# Altium integrated library Samtec 2,54 mm Pitch Socket Strips.IntLib: 489 symbols (part 2 of 4)
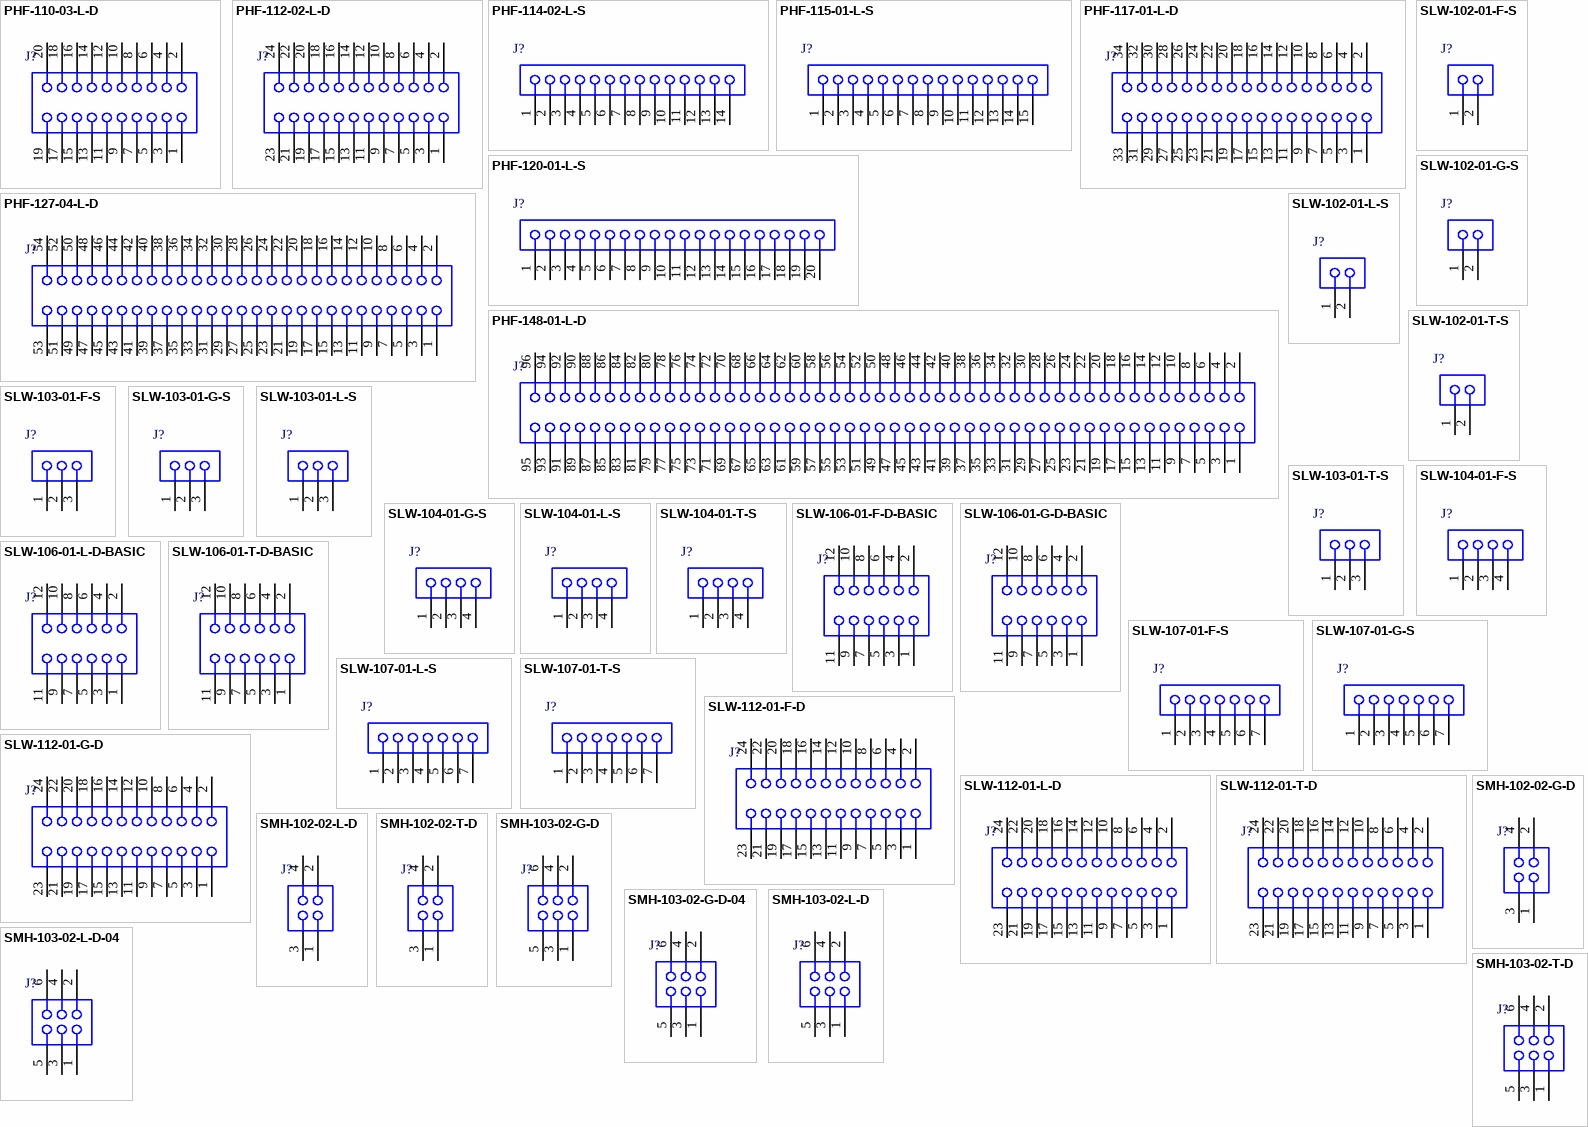
[diagram p14: symbols PHF-110-03-L-D to SMH-103-02-T-D]

## SLW-103-01-F-S
designator J?
Low Profile Socket Strips, Through-hole, Vertical, -55 to 125 degC, 2.54 mm Pitch, 3-Pin, Female, RoHS; Manufacturer: Samtec; PartNumber: SLW-103-01-F-S; Pitch: 2.54 mm; DatasheetVersion: F-214; PackageVersion: X, 9/1987; PackageReference: SLW-103-01-X-S; PackageDescription: Low Profile Socket Strip; Orientation: Vertical; RoHS: True; Temperature Range: -55 to 125 degC; Mounting Technology: Through-hole; ComponentLink1Description: Manufacturer URL; ComponentLink1URL: http://www.samtec.com; ComponentLink2Description: Datasheet; ComponentLink2URL: http://www.samtec.com/documents/webfiles/pdf/SLW.PDF; ComponentLink3Description: Package Specification; ComponentLink3URL: http://www.samtec.com/documents/webfiles/cpdf/SLW-1XX-01-X-X-MKT.pdf
footprint SMTC-SLW-103-01-X-S (Low Profile Socket Strip, 1x3 Pins, Vertical, 2.54mm Pitch, Female)
pins: 1, 2, 3

## SLW-103-01-G-S
designator J?
Low Profile Socket Strips, Through-hole, Vertical, -55 to 125 degC, 2.54 mm Pitch, 3-Pin, Female, RoHS; Manufacturer: Samtec; PartNumber: SLW-103-01-G-S; Pitch: 2.54 mm; DatasheetVersion: F-214; PackageVersion: X, 9/1987; PackageReference: SLW-103-01-X-S; PackageDescription: Low Profile Socket Strip; Supplier 1: Digi-Key; Supplier Part Number 1: SAM1089-03-ND; Supplier 2: Newark; Supplier Part Number 2: 11P6851; Orientation: Vertical; RoHS: True; Temperature Range: -55 to 125 degC; Mounting Technology: Through-hole; ComponentLink1Description: Manufacturer URL; ComponentLink1URL: http://www.samtec.com; ComponentLink2Description: Datasheet; ComponentLink2URL: http://www.samtec.com/documents/webfiles/pdf/SLW.PDF; ComponentLink3Description: Package Specification; ComponentLink3URL: http://www.samtec.com/documents/webfiles/cpdf/SLW-1XX-01-X-X-MKT.pdf
footprint SMTC-SLW-103-01-X-S (Low Profile Socket Strip, 1x3 Pins, Vertical, 2.54mm Pitch, Female)
pins: 1, 2, 3

## SLW-103-01-L-S
designator J?
Low Profile Socket Strips, Through-hole, Vertical, -55 to 125 degC, 2.54 mm Pitch, 3-Pin, Female, RoHS; Manufacturer: Samtec; PartNumber: SLW-103-01-L-S; Pitch: 2.54 mm; DatasheetVersion: F-214; PackageVersion: X, 9/1987; PackageReference: SLW-103-01-X-S; PackageDescription: Low Profile Socket Strip; Orientation: Vertical; RoHS: True; Temperature Range: -55 to 125 degC; Mounting Technology: Through-hole; ComponentLink1Description: Manufacturer URL; ComponentLink1URL: http://www.samtec.com; ComponentLink2Description: Datasheet; ComponentLink2URL: http://www.samtec.com/documents/webfiles/pdf/SLW.PDF; ComponentLink3Description: Package Specification; ComponentLink3URL: http://www.samtec.com/documents/webfiles/cpdf/SLW-1XX-01-X-X-MKT.pdf
footprint SMTC-SLW-103-01-X-S (Low Profile Socket Strip, 1x3 Pins, Vertical, 2.54mm Pitch, Female)
pins: 1, 2, 3

## SLW-103-01-T-S
designator J?
Low Profile Socket Strips, Through-hole, Vertical, -55 to 105 degC, 2.54 mm Pitch, 3-Pin, Female, RoHS; Manufacturer: Samtec; PartNumber: SLW-103-01-T-S; Pitch: 2.54 mm; DatasheetVersion: F-214; PackageVersion: X, 9/1987; PackageReference: SLW-103-01-X-S; PackageDescription: Low Profile Socket Strip; Supplier 1: Digi-Key; Supplier Part Number 1: SAM1093-03-ND; Supplier 2: Newark; Supplier Part Number 2: 11P6855; Orientation: Vertical; RoHS: True; Temperature Range: -55 to 105 degC; Mounting Technology: Through-hole; ComponentLink1Description: Manufacturer URL; ComponentLink1URL: http://www.samtec.com; ComponentLink2Description: Datasheet; ComponentLink2URL: http://www.samtec.com/documents/webfiles/pdf/SLW.PDF; ComponentLink3Description: Package Specification; ComponentLink3URL: http://www.samtec.com/documents/webfiles/cpdf/SLW-1XX-01-X-X-MKT.pdf
footprint SMTC-SLW-103-01-X-S (Low Profile Socket Strip, 1x3 Pins, Vertical, 2.54mm Pitch, Female)
pins: 1, 2, 3

## SLW-104-01-F-S
designator J?
Low Profile Socket Strips, Through-hole, Vertical, -55 to 125 degC, 2.54 mm Pitch, 4-Pin, Female, RoHS; Manufacturer: Samtec; PartNumber: SLW-104-01-F-S; Pitch: 2.54 mm; DatasheetVersion: F-214; PackageVersion: X, 9/1987; PackageReference: SLW-104-01-X-S; PackageDescription: Low Profile Socket Strip; Supplier 1: Newark; Supplier Part Number 1: 97P7710; Orientation: Vertical; RoHS: True; Temperature Range: -55 to 125 degC; Mounting Technology: Through-hole; ComponentLink1Description: Manufacturer URL; ComponentLink1URL: http://www.samtec.com; ComponentLink2Description: Datasheet; ComponentLink2URL: http://www.samtec.com/documents/webfiles/pdf/SLW.PDF; ComponentLink3Description: Package Specification; ComponentLink3URL: http://www.samtec.com/documents/webfiles/cpdf/SLW-1XX-01-X-X-MKT.pdf
footprint SMTC-SLW-104-01-X-S (Low Profile Socket Strip, 1x4 Pins, Vertical, 2.54mm Pitch, Female)
pins: 1, 2, 3, 4

## SLW-104-01-G-S
designator J?
Low Profile Socket Strips, Through-hole, Vertical, -55 to 125 degC, 2.54 mm Pitch, 4-Pin, Female, RoHS; Manufacturer: Samtec; PartNumber: SLW-104-01-G-S; Pitch: 2.54 mm; DatasheetVersion: F-214; PackageVersion: X, 9/1987; PackageReference: SLW-104-01-X-S; PackageDescription: Low Profile Socket Strip; Supplier 1: Digi-Key; Supplier Part Number 1: SAM1089-04-ND; Supplier 2: Farnell; Supplier Part Number 2: 1668095; Supplier 3: Newark; Supplier Part Number 3: 11P6857; Orientation: Vertical; RoHS: True; Temperature Range: -55 to 125 degC; Mounting Technology: Through-hole; ComponentLink1Description: Manufacturer URL; ComponentLink1URL: http://www.samtec.com; ComponentLink2Description: Datasheet; ComponentLink2URL: http://www.samtec.com/documents/webfiles/pdf/SLW.PDF; ComponentLink3Description: Package Specification; ComponentLink3URL: http://www.samtec.com/documents/webfiles/cpdf/SLW-1XX-01-X-X-MKT.pdf
footprint SMTC-SLW-104-01-X-S (Low Profile Socket Strip, 1x4 Pins, Vertical, 2.54mm Pitch, Female)
pins: 1, 2, 3, 4

## SLW-104-01-L-S
designator J?
Low Profile Socket Strips, Through-hole, Vertical, -55 to 125 degC, 2.54 mm Pitch, 4-Pin, Female, RoHS; Manufacturer: Samtec; PartNumber: SLW-104-01-L-S; Pitch: 2.54 mm; DatasheetVersion: F-214; PackageVersion: X, 9/1987; PackageReference: SLW-104-01-X-S; PackageDescription: Low Profile Socket Strip; Orientation: Vertical; RoHS: True; Temperature Range: -55 to 125 degC; Mounting Technology: Through-hole; ComponentLink1Description: Manufacturer URL; ComponentLink1URL: http://www.samtec.com; ComponentLink2Description: Datasheet; ComponentLink2URL: http://www.samtec.com/documents/webfiles/pdf/SLW.PDF; ComponentLink3Description: Package Specification; ComponentLink3URL: http://www.samtec.com/documents/webfiles/cpdf/SLW-1XX-01-X-X-MKT.pdf
footprint SMTC-SLW-104-01-X-S (Low Profile Socket Strip, 1x4 Pins, Vertical, 2.54mm Pitch, Female)
pins: 1, 2, 3, 4

## SLW-104-01-T-S
designator J?
Low Profile Socket Strips, Through-hole, Vertical, -55 to 105 degC, 2.54 mm Pitch, 4-Pin, Female, RoHS; Manufacturer: Samtec; PartNumber: SLW-104-01-T-S; Pitch: 2.54 mm; DatasheetVersion: F-214; PackageVersion: X, 9/1987; PackageReference: SLW-104-01-X-S; PackageDescription: Low Profile Socket Strip; Supplier 1: Digi-Key; Supplier Part Number 1: SAM1093-04-ND; Supplier 2: Newark; Supplier Part Number 2: 11P6861; Orientation: Vertical; RoHS: True; Temperature Range: -55 to 105 degC; Mounting Technology: Through-hole; ComponentLink1Description: Manufacturer URL; ComponentLink1URL: http://www.samtec.com; ComponentLink2Description: Datasheet; ComponentLink2URL: http://www.samtec.com/documents/webfiles/pdf/SLW.PDF; ComponentLink3Description: Package Specification; ComponentLink3URL: http://www.samtec.com/documents/webfiles/cpdf/SLW-1XX-01-X-X-MKT.pdf
footprint SMTC-SLW-104-01-X-S (Low Profile Socket Strip, 1x4 Pins, Vertical, 2.54mm Pitch, Female)
pins: 1, 2, 3, 4

## SLW-106-01-F-D-BASIC
designator J?
Low Profile Socket Strips, Through-hole, Vertical, -55 to 125 degC, 2.54 mm Pitch, 12-Pin, Female, RoHS; Manufacturer: Samtec; PartNumber: SLW-106-01-F-D-BASIC; Pitch: 2.54 mm; DatasheetVersion: F-214; PackageVersion: X, 9/1987; PackageReference: SLW-106-01-X-D-BASIC; PackageDescription: Low Profile Socket Strip; Orientation: Vertical; RoHS: True; Temperature Range: -55 to 125 degC; Mounting Technology: Through-hole; ComponentLink1Description: Manufacturer URL; ComponentLink1URL: http://www.samtec.com; ComponentLink2Description: Datasheet; ComponentLink2URL: http://www.samtec.com/documents/webfiles/pdf/SLW.PDF; ComponentLink3Description: Package Specification; ComponentLink3URL: http://www.samtec.com/documents/webfiles/cpdf/SLW-1XX-01-X-X-MKT.pdf
footprint SMTC-SLW-106-01-X-D-BASIC (Low Profile Socket Strip, 2x6 Pins, Vertical, 2.54mm Pitch, Female)
pins: 1, 2, 3, 4, 5, 6, 7, 8, 9, 10, 11, 12

## SLW-106-01-G-D-BASIC
designator J?
Low Profile Socket Strips, Through-hole, Vertical, -55 to 125 degC, 2.54 mm Pitch, 12-Pin, Female, RoHS; Manufacturer: Samtec; PartNumber: SLW-106-01-G-D-BASIC; Pitch: 2.54 mm; DatasheetVersion: F-214; PackageVersion: X, 9/1987; PackageReference: SLW-106-01-X-D-BASIC; PackageDescription: Low Profile Socket Strip; Orientation: Vertical; RoHS: True; Temperature Range: -55 to 125 degC; Mounting Technology: Through-hole; ComponentLink1Description: Manufacturer URL; ComponentLink1URL: http://www.samtec.com; ComponentLink2Description: Datasheet; ComponentLink2URL: http://www.samtec.com/documents/webfiles/pdf/SLW.PDF; ComponentLink3Description: Package Specification; ComponentLink3URL: http://www.samtec.com/documents/webfiles/cpdf/SLW-1XX-01-X-X-MKT.pdf
footprint SMTC-SLW-106-01-X-D-BASIC (Low Profile Socket Strip, 2x6 Pins, Vertical, 2.54mm Pitch, Female)
pins: 1, 2, 3, 4, 5, 6, 7, 8, 9, 10, 11, 12

## SLW-106-01-L-D-BASIC
designator J?
Low Profile Socket Strips, Through-hole, Vertical, -55 to 125 degC, 2.54 mm Pitch, 12-Pin, Female, RoHS; Manufacturer: Samtec; PartNumber: SLW-106-01-L-D-BASIC; Pitch: 2.54 mm; DatasheetVersion: F-214; PackageVersion: X, 9/1987; PackageReference: SLW-106-01-X-D-BASIC; PackageDescription: Low Profile Socket Strip; Orientation: Vertical; RoHS: True; Temperature Range: -55 to 125 degC; Mounting Technology: Through-hole; ComponentLink1Description: Manufacturer URL; ComponentLink1URL: http://www.samtec.com; ComponentLink2Description: Datasheet; ComponentLink2URL: http://www.samtec.com/documents/webfiles/pdf/SLW.PDF; ComponentLink3Description: Package Specification; ComponentLink3URL: http://www.samtec.com/documents/webfiles/cpdf/SLW-1XX-01-X-X-MKT.pdf
footprint SMTC-SLW-106-01-X-D-BASIC (Low Profile Socket Strip, 2x6 Pins, Vertical, 2.54mm Pitch, Female)
pins: 1, 2, 3, 4, 5, 6, 7, 8, 9, 10, 11, 12

## SLW-106-01-T-D-BASIC
designator J?
Low Profile Socket Strips, Through-hole, Vertical, -55 to 105 degC, 2.54 mm Pitch, 12-Pin, Female, RoHS; Manufacturer: Samtec; PartNumber: SLW-106-01-T-D-BASIC; Pitch: 2.54 mm; DatasheetVersion: F-214; PackageVersion: X, 9/1987; PackageReference: SLW-106-01-X-D-BASIC; PackageDescription: Low Profile Socket Strip; Orientation: Vertical; RoHS: True; Temperature Range: -55 to 105 degC; Mounting Technology: Through-hole; ComponentLink1Description: Manufacturer URL; ComponentLink1URL: http://www.samtec.com; ComponentLink2Description: Datasheet; ComponentLink2URL: http://www.samtec.com/documents/webfiles/pdf/SLW.PDF; ComponentLink3Description: Package Specification; ComponentLink3URL: http://www.samtec.com/documents/webfiles/cpdf/SLW-1XX-01-X-X-MKT.pdf
footprint SMTC-SLW-106-01-X-D-BASIC (Low Profile Socket Strip, 2x6 Pins, Vertical, 2.54mm Pitch, Female)
pins: 1, 2, 3, 4, 5, 6, 7, 8, 9, 10, 11, 12

## SLW-107-01-F-S
designator J?
Low Profile Socket Strips, Through-hole, Vertical, -55 to 125 degC, 2.54 mm Pitch, 7-Pin, Female, RoHS; Manufacturer: Samtec; PartNumber: SLW-107-01-F-S; Pitch: 2.54 mm; DatasheetVersion: F-214; PackageVersion: X, 9/1987; PackageReference: SLW-107-01-X-S; PackageDescription: Low Profile Socket Strip; Orientation: Vertical; RoHS: True; Temperature Range: -55 to 125 degC; Mounting Technology: Through-hole; ComponentLink1Description: Manufacturer URL; ComponentLink1URL: http://www.samtec.com; ComponentLink2Description: Datasheet; ComponentLink2URL: http://www.samtec.com/documents/webfiles/pdf/SLW.PDF; ComponentLink3Description: Package Specification; ComponentLink3URL: http://www.samtec.com/documents/webfiles/cpdf/SLW-1XX-01-X-X-MKT.pdf
footprint SMTC-SLW-107-01-X-S (Low Profile Socket Strip, 1x7 Pins, Vertical, 2.54mm Pitch, Female)
pins: 1, 2, 3, 4, 5, 6, 7

## SLW-107-01-G-S
designator J?
Low Profile Socket Strips, Through-hole, Vertical, -55 to 125 degC, 2.54 mm Pitch, 7-Pin, Female, RoHS; Manufacturer: Samtec; PartNumber: SLW-107-01-G-S; Pitch: 2.54 mm; DatasheetVersion: F-214; PackageVersion: X, 9/1987; PackageReference: SLW-107-01-X-S; PackageDescription: Low Profile Socket Strip; Supplier 1: Digi-Key; Supplier Part Number 1: SAM1089-07-ND; Orientation: Vertical; RoHS: True; Temperature Range: -55 to 125 degC; Mounting Technology: Through-hole; ComponentLink1Description: Manufacturer URL; ComponentLink1URL: http://www.samtec.com; ComponentLink2Description: Datasheet; ComponentLink2URL: http://www.samtec.com/documents/webfiles/pdf/SLW.PDF; ComponentLink3Description: Package Specification; ComponentLink3URL: http://www.samtec.com/documents/webfiles/cpdf/SLW-1XX-01-X-X-MKT.pdf
footprint SMTC-SLW-107-01-X-S (Low Profile Socket Strip, 1x7 Pins, Vertical, 2.54mm Pitch, Female)
pins: 1, 2, 3, 4, 5, 6, 7

## SLW-107-01-L-S
designator J?
Low Profile Socket Strips, Through-hole, Vertical, -55 to 125 degC, 2.54 mm Pitch, 7-Pin, Female, RoHS; Manufacturer: Samtec; PartNumber: SLW-107-01-L-S; Pitch: 2.54 mm; DatasheetVersion: F-214; PackageVersion: X, 9/1987; PackageReference: SLW-107-01-X-S; PackageDescription: Low Profile Socket Strip; Orientation: Vertical; RoHS: True; Temperature Range: -55 to 125 degC; Mounting Technology: Through-hole; ComponentLink1Description: Manufacturer URL; ComponentLink1URL: http://www.samtec.com; ComponentLink2Description: Datasheet; ComponentLink2URL: http://www.samtec.com/documents/webfiles/pdf/SLW.PDF; ComponentLink3Description: Package Specification; ComponentLink3URL: http://www.samtec.com/documents/webfiles/cpdf/SLW-1XX-01-X-X-MKT.pdf
footprint SMTC-SLW-107-01-X-S (Low Profile Socket Strip, 1x7 Pins, Vertical, 2.54mm Pitch, Female)
pins: 1, 2, 3, 4, 5, 6, 7

## SLW-107-01-T-S
designator J?
Low Profile Socket Strips, Through-hole, Vertical, -55 to 105 degC, 2.54 mm Pitch, 7-Pin, Female, RoHS; Manufacturer: Samtec; PartNumber: SLW-107-01-T-S; Pitch: 2.54 mm; DatasheetVersion: F-214; PackageVersion: X, 9/1987; PackageReference: SLW-107-01-X-S; PackageDescription: Low Profile Socket Strip; Supplier 1: Digi-Key; Supplier Part Number 1: SAM1093-07-ND; Supplier 2: Newark; Supplier Part Number 2: 11P6879; Orientation: Vertical; RoHS: True; Temperature Range: -55 to 105 degC; Mounting Technology: Through-hole; ComponentLink1Description: Manufacturer URL; ComponentLink1URL: http://www.samtec.com; ComponentLink2Description: Datasheet; ComponentLink2URL: http://www.samtec.com/documents/webfiles/pdf/SLW.PDF; ComponentLink3Description: Package Specification; ComponentLink3URL: http://www.samtec.com/documents/webfiles/cpdf/SLW-1XX-01-X-X-MKT.pdf
footprint SMTC-SLW-107-01-X-S (Low Profile Socket Strip, 1x7 Pins, Vertical, 2.54mm Pitch, Female)
pins: 1, 2, 3, 4, 5, 6, 7

## SLW-112-01-F-D
designator J?
Low Profile Socket Strips, Through-hole, Vertical, -55 to 125 degC, 2.54 mm Pitch, 24-Pin, Female, RoHS; Manufacturer: Samtec; PartNumber: SLW-112-01-F-D; Pitch: 2.54 mm; DatasheetVersion: F-214; PackageVersion: X, 9/1987; PackageReference: SLW-112-01-X-D; PackageDescription: Low Profile Socket Strip; Orientation: Vertical; RoHS: True; Temperature Range: -55 to 125 degC; Mounting Technology: Through-hole; ComponentLink1Description: Manufacturer URL; ComponentLink1URL: http://www.samtec.com; ComponentLink2Description: Datasheet; ComponentLink2URL: http://www.samtec.com/documents/webfiles/pdf/SLW.PDF; ComponentLink3Description: Package Specification; ComponentLink3URL: http://www.samtec.com/documents/webfiles/cpdf/SLW-1XX-01-X-X-MKT.pdf
footprint SMTC-SLW-112-01-X-D (Low Profile Socket Strip, 2x12 Pins, Vertical, 2.54mm Pitch, Female)
pins: 1, 2, 3, 4, 5, 6, 7, 8, 9, 10, 11, 12, 13, 14, 15, 16, 17, 18, 19, 20, 21, 22, 23, 24

## SLW-112-01-G-D
designator J?
Low Profile Socket Strips, Through-hole, Vertical, -55 to 125 degC, 2.54 mm Pitch, 24-Pin, Female, RoHS; Manufacturer: Samtec; PartNumber: SLW-112-01-G-D; Pitch: 2.54 mm; DatasheetVersion: F-214; PackageVersion: X, 9/1987; PackageReference: SLW-112-01-X-D; PackageDescription: Low Profile Socket Strip; Supplier 1: Digi-Key; Supplier Part Number 1: SAM1088-12-ND; Supplier 2: Newark; Supplier Part Number 2: 11P6903; Orientation: Vertical; RoHS: True; Temperature Range: -55 to 125 degC; Mounting Technology: Through-hole; ComponentLink1Description: Manufacturer URL; ComponentLink1URL: http://www.samtec.com; ComponentLink2Description: Datasheet; ComponentLink2URL: http://www.samtec.com/documents/webfiles/pdf/SLW.PDF; ComponentLink3Description: Package Specification; ComponentLink3URL: http://www.samtec.com/documents/webfiles/cpdf/SLW-1XX-01-X-X-MKT.pdf
footprint SMTC-SLW-112-01-X-D (Low Profile Socket Strip, 2x12 Pins, Vertical, 2.54mm Pitch, Female)
pins: 1, 2, 3, 4, 5, 6, 7, 8, 9, 10, 11, 12, 13, 14, 15, 16, 17, 18, 19, 20, 21, 22, 23, 24

## SLW-112-01-L-D
designator J?
Low Profile Socket Strips, Through-hole, Vertical, -55 to 125 degC, 2.54 mm Pitch, 24-Pin, Female, RoHS; Manufacturer: Samtec; PartNumber: SLW-112-01-L-D; Pitch: 2.54 mm; DatasheetVersion: F-214; PackageVersion: X, 9/1987; PackageReference: SLW-112-01-X-D; PackageDescription: Low Profile Socket Strip; Orientation: Vertical; RoHS: True; Temperature Range: -55 to 125 degC; Mounting Technology: Through-hole; ComponentLink1Description: Manufacturer URL; ComponentLink1URL: http://www.samtec.com; ComponentLink2Description: Datasheet; ComponentLink2URL: http://www.samtec.com/documents/webfiles/pdf/SLW.PDF; ComponentLink3Description: Package Specification; ComponentLink3URL: http://www.samtec.com/documents/webfiles/cpdf/SLW-1XX-01-X-X-MKT.pdf
footprint SMTC-SLW-112-01-X-D (Low Profile Socket Strip, 2x12 Pins, Vertical, 2.54mm Pitch, Female)
pins: 1, 2, 3, 4, 5, 6, 7, 8, 9, 10, 11, 12, 13, 14, 15, 16, 17, 18, 19, 20, 21, 22, 23, 24

## SLW-112-01-T-D
designator J?
Low Profile Socket Strips, Through-hole, Vertical, -55 to 105 degC, 2.54 mm Pitch, 24-Pin, Female, RoHS; Manufacturer: Samtec; PartNumber: SLW-112-01-T-D; Pitch: 2.54 mm; DatasheetVersion: F-214; PackageVersion: X, 9/1987; PackageReference: SLW-112-01-X-D; PackageDescription: Low Profile Socket Strip; Supplier 1: Digi-Key; Supplier Part Number 1: SAM1092-12-ND; Supplier 2: Newark; Supplier Part Number 2: 11P6907; Orientation: Vertical; RoHS: True; Temperature Range: -55 to 105 degC; Mounting Technology: Through-hole; ComponentLink1Description: Manufacturer URL; ComponentLink1URL: http://www.samtec.com; ComponentLink2Description: Datasheet; ComponentLink2URL: http://www.samtec.com/documents/webfiles/pdf/SLW.PDF; ComponentLink3Description: Package Specification; ComponentLink3URL: http://www.samtec.com/documents/webfiles/cpdf/SLW-1XX-01-X-X-MKT.pdf
footprint SMTC-SLW-112-01-X-D (Low Profile Socket Strip, 2x12 Pins, Vertical, 2.54mm Pitch, Female)
pins: 1, 2, 3, 4, 5, 6, 7, 8, 9, 10, 11, 12, 13, 14, 15, 16, 17, 18, 19, 20, 21, 22, 23, 24

## SMH-102-02-G-D
designator J?
SMT Horizontal Socket, -55 to 125 degC, 2.54 mm Pitch, 4-Pin, Female, RoHS; Manufacturer: Samtec; PartNumber: SMH-102-02-G-D; Pitch: 2.54 mm; DatasheetVersion: F-214; PackageVersion: AF, 2/1999; PackageReference: SMH-102-02-X-D; PackageDescription: .100 [2.54] Horizontal SMT Socket Assembly; Orientation: Horizontal; RoHS: True; Temperature Range: -55 to 125 degC; Mounting Technology: Surface Mount; ComponentLink1Description: Manufacturer URL; ComponentLink1URL: http://www.samtec.com; ComponentLink2Description: Datasheet; ComponentLink2URL: http://www.samtec.com/documents/webfiles/pdf/SMH.PDF; ComponentLink3Description: Package Specification; ComponentLink3URL: http://www.samtec.com/documents/webfiles/cpdf/SMH-1XX-XX-XX-X-XX-MKT.pdf
footprint SMTC-SMH-102-02-X-D (Horizontal SMT Socket Assembly, 2x2 Pins, 2.54mm Pitch, Female)
pins: 1, 2, 3, 4

## SMH-102-02-L-D
designator J?
SMT Horizontal Socket, -55 to 125 degC, 2.54 mm Pitch, 4-Pin, Female, RoHS; Manufacturer: Samtec; PartNumber: SMH-102-02-L-D; Pitch: 2.54 mm; DatasheetVersion: F-214; PackageVersion: AF, 2/1999; PackageReference: SMH-102-02-X-D; PackageDescription: .100 [2.54] Horizontal SMT Socket Assembly; Supplier 1: Newark; Supplier Part Number 1: 85T6346; Orientation: Horizontal; RoHS: True; Temperature Range: -55 to 125 degC; Mounting Technology: Surface Mount; ComponentLink1Description: Manufacturer URL; ComponentLink1URL: http://www.samtec.com; ComponentLink2Description: Datasheet; ComponentLink2URL: http://www.samtec.com/documents/webfiles/pdf/SMH.PDF; ComponentLink3Description: Package Specification; ComponentLink3URL: http://www.samtec.com/documents/webfiles/cpdf/SMH-1XX-XX-XX-X-XX-MKT.pdf
footprint SMTC-SMH-102-02-X-D (Horizontal SMT Socket Assembly, 2x2 Pins, 2.54mm Pitch, Female)
pins: 1, 2, 3, 4

## SMH-102-02-T-D
designator J?
SMT Horizontal Socket, -55 to 105 degC, 2.54 mm Pitch, 4-Pin, Female, RoHS; Manufacturer: Samtec; PartNumber: SMH-102-02-T-D; Pitch: 2.54 mm; DatasheetVersion: F-214; PackageVersion: AF, 2/1999; PackageReference: SMH-102-02-X-D; PackageDescription: .100 [2.54] Horizontal SMT Socket Assembly; Orientation: Horizontal; RoHS: True; Temperature Range: -55 to 105 degC; Mounting Technology: Surface Mount; ComponentLink1Description: Manufacturer URL; ComponentLink1URL: http://www.samtec.com; ComponentLink2Description: Datasheet; ComponentLink2URL: http://www.samtec.com/documents/webfiles/pdf/SMH.PDF; ComponentLink3Description: Package Specification; ComponentLink3URL: http://www.samtec.com/documents/webfiles/cpdf/SMH-1XX-XX-XX-X-XX-MKT.pdf
footprint SMTC-SMH-102-02-X-D (Horizontal SMT Socket Assembly, 2x2 Pins, 2.54mm Pitch, Female)
pins: 1, 2, 3, 4

## SMH-103-02-G-D
designator J?
SMT Horizontal Socket, -55 to 125 degC, 2.54 mm Pitch, 6-Pin, Female, RoHS; Manufacturer: Samtec; PartNumber: SMH-103-02-G-D; Pitch: 2.54 mm; DatasheetVersion: F-214; PackageVersion: AF, 2/1999; PackageReference: SMH-103-02-X-D; PackageDescription: .100 [2.54] Horizontal SMT Socket Assembly; Orientation: Horizontal; RoHS: True; Temperature Range: -55 to 125 degC; Mounting Technology: Surface Mount; ComponentLink1Description: Manufacturer URL; ComponentLink1URL: http://www.samtec.com; ComponentLink2Description: Datasheet; ComponentLink2URL: http://www.samtec.com/documents/webfiles/pdf/SMH.PDF; ComponentLink3Description: Package Specification; ComponentLink3URL: http://www.samtec.com/documents/webfiles/cpdf/SMH-1XX-XX-XX-X-XX-MKT.pdf
footprint SMTC-SMH-103-02-X-D (Horizontal SMT Socket Assembly, 2x3 Pins, 2.54mm Pitch, Female)
pins: 1, 2, 3, 4, 5, 6

## SMH-103-02-G-D-04
designator J?
SMT Horizontal Socket, -55 to 125 degC, 2.54 mm Pitch, 6-Pin, Female, RoHS; Manufacturer: Samtec; PartNumber: SMH-103-02-G-D-04; Pitch: 2.54 mm; DatasheetVersion: F-214; PackageVersion: AF, 2/1999; PackageReference: SMH-103-02-X-D-04; PackageDescription: .100 [2.54] Horizontal SMT Socket Assembly; Orientation: Horizontal; RoHS: True; Temperature Range: -55 to 125 degC; Mounting Technology: Surface Mount; ComponentLink1Description: Manufacturer URL; ComponentLink1URL: http://www.samtec.com; ComponentLink2Description: Datasheet; ComponentLink2URL: http://www.samtec.com/documents/webfiles/pdf/SMH.PDF; ComponentLink3Description: Package Specification; ComponentLink3URL: http://www.samtec.com/documents/webfiles/cpdf/SMH-1XX-XX-XX-X-XX-MKT.pdf
footprint SMTC-SMH-103-02-X-D-04 (Horizontal SMT Socket Assembly, 2x3 Pins, 2.54mm Pitch, Female)
pins: 1, 2, 3, 4, 5, 6

## SMH-103-02-L-D
designator J?
SMT Horizontal Socket, -55 to 125 degC, 2.54 mm Pitch, 6-Pin, Female, RoHS; Manufacturer: Samtec; PartNumber: SMH-103-02-L-D; Pitch: 2.54 mm; DatasheetVersion: F-214; PackageVersion: AF, 2/1999; PackageReference: SMH-103-02-X-D; PackageDescription: .100 [2.54] Horizontal SMT Socket Assembly; Orientation: Horizontal; RoHS: True; Temperature Range: -55 to 125 degC; Mounting Technology: Surface Mount; ComponentLink1Description: Manufacturer URL; ComponentLink1URL: http://www.samtec.com; ComponentLink2Description: Datasheet; ComponentLink2URL: http://www.samtec.com/documents/webfiles/pdf/SMH.PDF; ComponentLink3Description: Package Specification; ComponentLink3URL: http://www.samtec.com/documents/webfiles/cpdf/SMH-1XX-XX-XX-X-XX-MKT.pdf
footprint SMTC-SMH-103-02-X-D (Horizontal SMT Socket Assembly, 2x3 Pins, 2.54mm Pitch, Female)
pins: 1, 2, 3, 4, 5, 6

## SMH-103-02-L-D-04
designator J?
SMT Horizontal Socket, -55 to 125 degC, 2.54 mm Pitch, 6-Pin, Female, RoHS; Manufacturer: Samtec; PartNumber: SMH-103-02-L-D-04; Pitch: 2.54 mm; DatasheetVersion: F-214; PackageVersion: AF, 2/1999; PackageReference: SMH-103-02-X-D-04; PackageDescription: .100 [2.54] Horizontal SMT Socket Assembly; Orientation: Horizontal; RoHS: True; Temperature Range: -55 to 125 degC; Mounting Technology: Surface Mount; ComponentLink1Description: Manufacturer URL; ComponentLink1URL: http://www.samtec.com; ComponentLink2Description: Datasheet; ComponentLink2URL: http://www.samtec.com/documents/webfiles/pdf/SMH.PDF; ComponentLink3Description: Package Specification; ComponentLink3URL: http://www.samtec.com/documents/webfiles/cpdf/SMH-1XX-XX-XX-X-XX-MKT.pdf
footprint SMTC-SMH-103-02-X-D-04 (Horizontal SMT Socket Assembly, 2x3 Pins, 2.54mm Pitch, Female)
pins: 1, 2, 3, 4, 5, 6

## SMH-103-02-T-D
designator J?
SMT Horizontal Socket, -55 to 105 degC, 2.54 mm Pitch, 6-Pin, Female, RoHS; Manufacturer: Samtec; PartNumber: SMH-103-02-T-D; Pitch: 2.54 mm; DatasheetVersion: F-214; PackageVersion: AF, 2/1999; PackageReference: SMH-103-02-X-D; PackageDescription: .100 [2.54] Horizontal SMT Socket Assembly; Supplier 1: Newark; Supplier Part Number 1: 97P7844; Orientation: Horizontal; RoHS: True; Temperature Range: -55 to 105 degC; Mounting Technology: Surface Mount; ComponentLink1Description: Manufacturer URL; ComponentLink1URL: http://www.samtec.com; ComponentLink2Description: Datasheet; ComponentLink2URL: http://www.samtec.com/documents/webfiles/pdf/SMH.PDF; ComponentLink3Description: Package Specification; ComponentLink3URL: http://www.samtec.com/documents/webfiles/cpdf/SMH-1XX-XX-XX-X-XX-MKT.pdf
footprint SMTC-SMH-103-02-X-D (Horizontal SMT Socket Assembly, 2x3 Pins, 2.54mm Pitch, Female)
pins: 1, 2, 3, 4, 5, 6

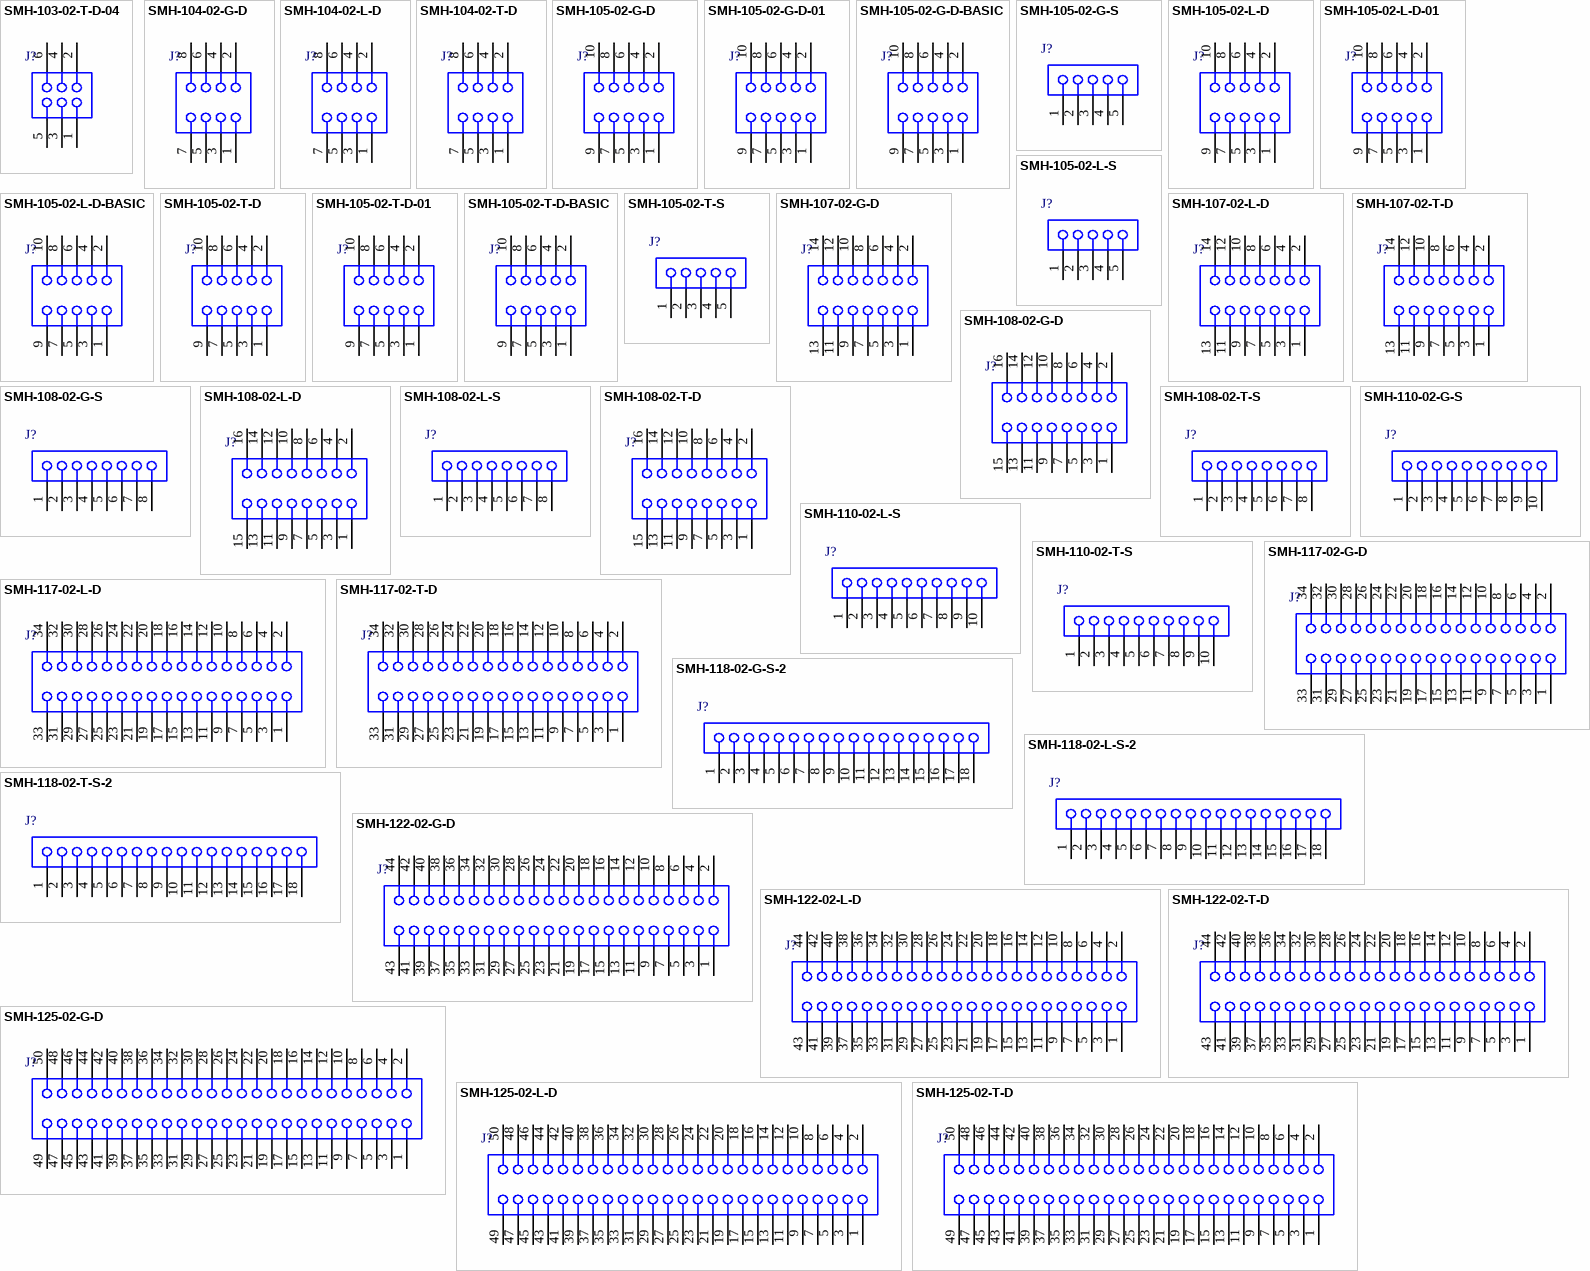
[diagram p4: symbols SMH-103-02-T-D-04 to SMH-125-02-T-D]

## SMH-103-02-T-D-04
designator J?
SMT Horizontal Socket, -55 to 105 degC, 2.54 mm Pitch, 6-Pin, Female, RoHS; Manufacturer: Samtec; PartNumber: SMH-103-02-T-D-04; Pitch: 2.54 mm; DatasheetVersion: F-214; PackageVersion: AF, 2/1999; PackageReference: SMH-103-02-X-D-04; PackageDescription: .100 [2.54] Horizontal SMT Socket Assembly; Orientation: Horizontal; RoHS: True; Temperature Range: -55 to 105 degC; Mounting Technology: Surface Mount; ComponentLink1Description: Manufacturer URL; ComponentLink1URL: http://www.samtec.com; ComponentLink2Description: Datasheet; ComponentLink2URL: http://www.samtec.com/documents/webfiles/pdf/SMH.PDF; ComponentLink3Description: Package Specification; ComponentLink3URL: http://www.samtec.com/documents/webfiles/cpdf/SMH-1XX-XX-XX-X-XX-MKT.pdf
footprint SMTC-SMH-103-02-X-D-04 (Horizontal SMT Socket Assembly, 2x3 Pins, 2.54mm Pitch, Female)
pins: 1, 2, 3, 4, 5, 6

## SMH-104-02-G-D
designator J?